# Altium schematic symbol library Molex FFC - FPC Connectors (SMT).SchLib: 638 symbols (part 9 of 10)
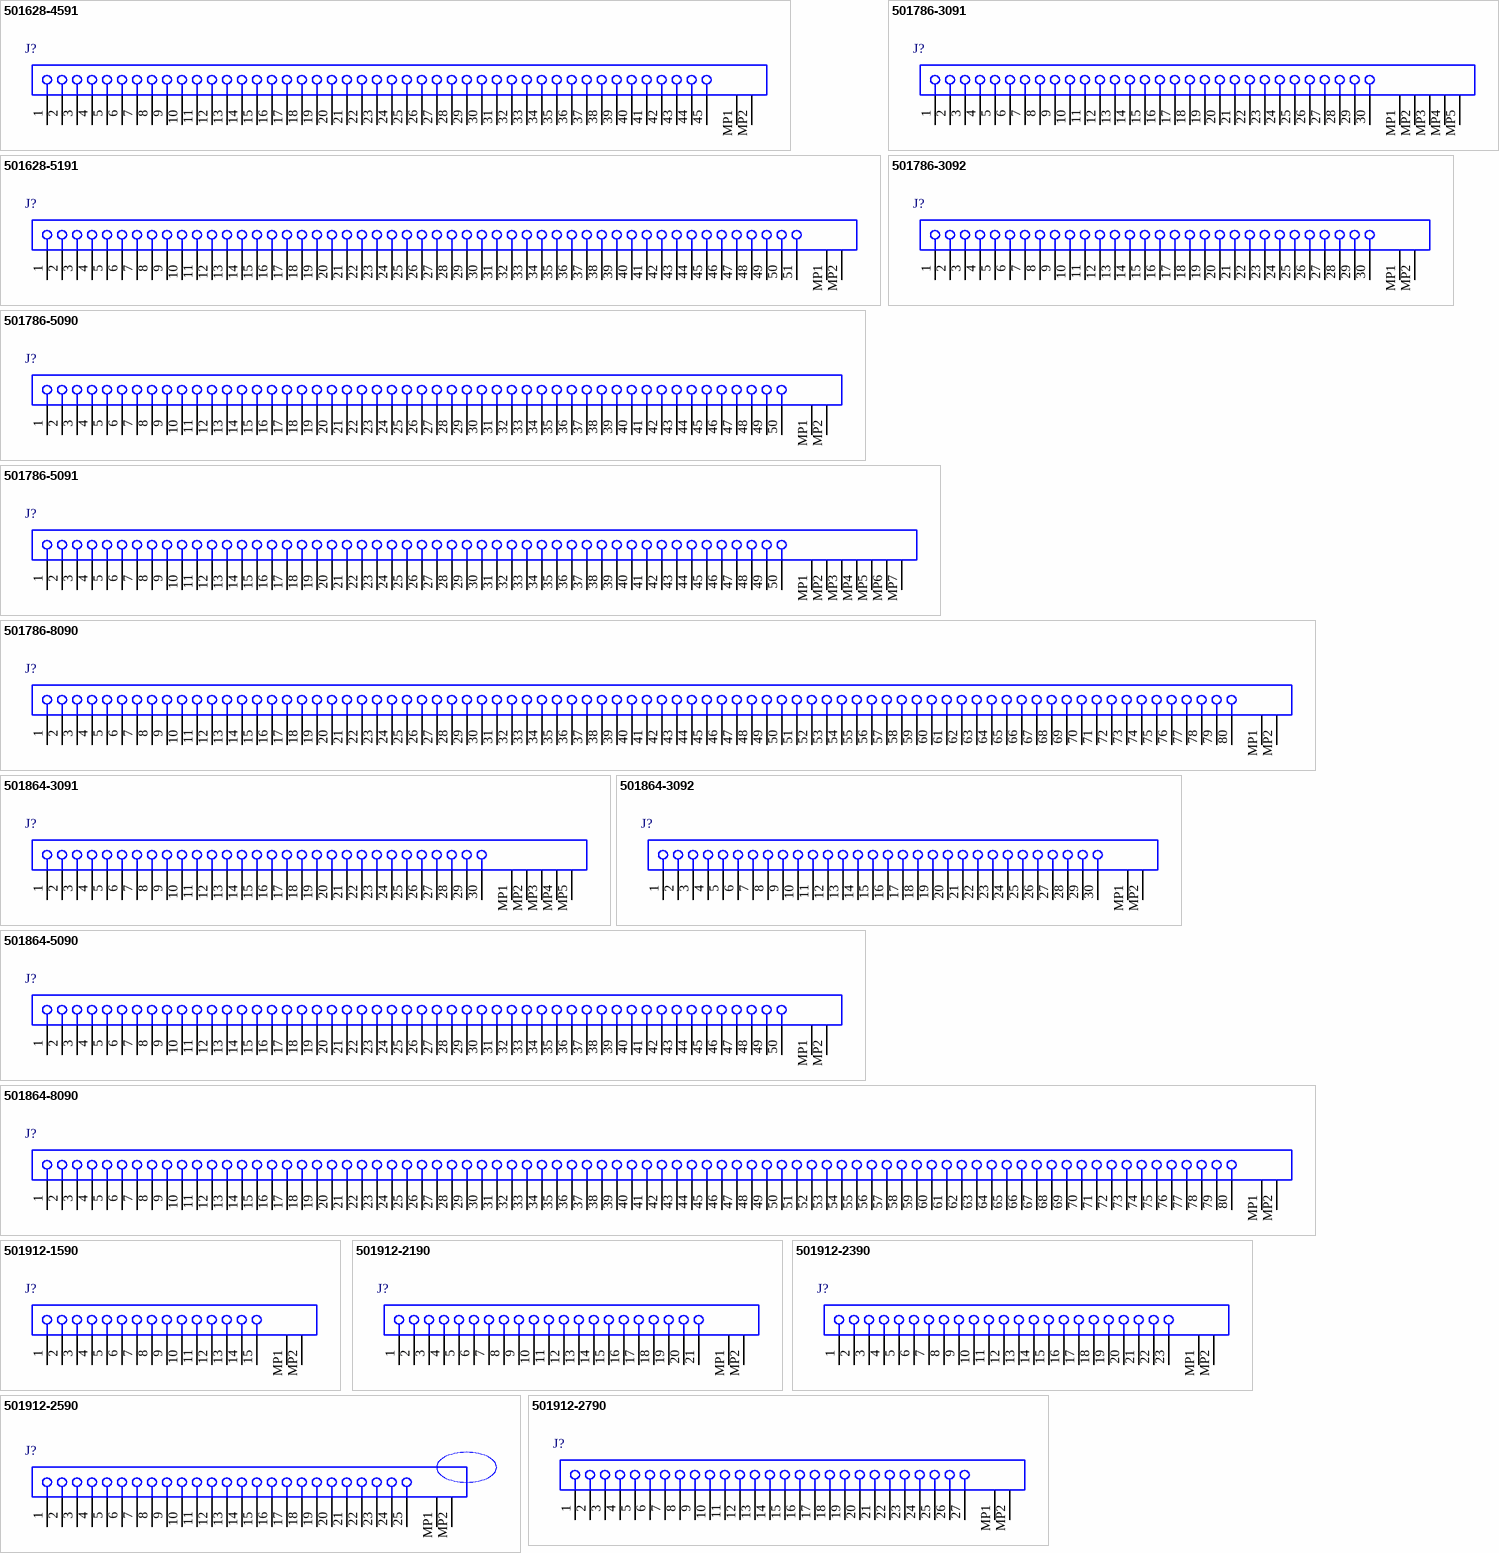
[diagram p29: symbols 501628-4591 to 501912-2790]

## 501786-3092
designator J?
0.5 mm Pitch Easy-On(TM) Type FFC Connector, 8.95 mm Mated Height, Vertical, SMT, 30 Circuits, -40 to 85 degC, ELV and RoHS Compliant, Tape and Reel; Manufacturer: Molex; PartNumber: 501786-3092; Circuits (Loaded): 30; Current (Max per Contact): 0.5A; Durability (mating cycles max): 20; Mated Height: 8.95mm; Material - Metal: Copper Alloy; Material - Plating Mating: Gold; PCB Locator: Yes; Pitch - Mating Interface: 0.50mm; Stackable: No; Voltage (Max): 50V AC (RMS)/DC; PackageVersion: Rev. A, 10/2009; PackageReference: 501786-3092; PackageDescription: 30-Lead FFC Connector, Pitch 0.5 mm; Contact Position: N/A; Entry Angle: Vertical; Material - Plating Termination: Gold; Number of Rows: 1; Orientation: Vertical; Packing: Tape and Reel; PCB Retention: Yes; Polarized to PCB: Yes; RoHS: TRUE; Mounting Technology: Surface Mount; ComponentLink1Description: Manufacturer URL; ComponentLink1URL: http://www.molex.com/molex/index.jsp; ComponentLink2Description: Datasheet; ComponentLink2URL: http://www.molex.com/webdocs/datasheets/pdf/en-us/5017863092_FFC_FPC_CONNECTORS.pdf; ComponentLink3Description: Package Specification; ComponentLink3URL: http://www.molex.com/pdm_docs/sd/5017863092_sd.pdf
footprint MOLX-501786-3092 (FFC Connector, 30-Leads, Vertical, Pitch 0.5 mm, Mated Height 8.95 mm, SMT)
pins: 1, 2, 3, 4, 5, 6, 7, 8, 9, 10, 11, 12, 13, 14, 15, 16, 17, 18, 19, 20, 21, 22, 23, 24, 25, 26, 27, 28, 29, 30, MP1, MP2

## 501786-5090
designator J?
0.5 mm Pitch Easy-On(TM) Type FFC Connector, 8.95 mm Mated Height, Vertical, SMT, 50 Circuits, -40 to 85 degC, ELV and RoHS Compliant, Tape and Reel; Manufacturer: Molex; PartNumber: 501786-5090; Circuits (Loaded): 50; Current (Max per Contact): 0.5A; Durability (mating cycles max): 20; Mated Height: 8.95mm; Material - Metal: Copper Alloy; Material - Plating Mating: Gold; PCB Locator: Yes; Pitch - Mating Interface: 0.50mm; Stackable: No; Voltage (Max): 50V AC (RMS)/DC; PackageVersion: Rev. A, 05/2010; PackageReference: 501786-5090; PackageDescription: 50-Lead FFC Connector, Pitch 0.5 mm; Contact Position: N/A; Entry Angle: Vertical; Material - Plating Termination: Gold; Number of Rows: 1; Orientation: Vertical; Packing: Tape and Reel; PCB Retention: Yes; Polarized to PCB: Yes; RoHS: TRUE; Mounting Technology: Surface Mount; ComponentLink1Description: Manufacturer URL; ComponentLink1URL: http://www.molex.com/molex/index.jsp; ComponentLink2Description: Datasheet; ComponentLink2URL: http://www.molex.com/webdocs/datasheets/pdf/en-us/5017865090_FFC_FPC_CONNECTORS.pdf; ComponentLink3Description: Package Specification; ComponentLink3URL: http://www.molex.com/pdm_docs/sd/5017865090_sd.pdf
footprint MOLX-501786-5090 (FFC Connector, 50-Leads, Vertical, Pitch 0.5 mm, Mated Height 8.95 mm, SMT)
pins: 1, 2, 3, 4, 5, 6, 7, 8, 9, 10, 11, 12, 13, 14, 15, 16, 17, 18, 19, 20, 21, 22, 23, 24, 25, 26, 27, 28, 29, 30, 31, 32, 33, 34, 35, 36, 37, 38, 39, 40, 41, 42, 43, 44, 45, 46, 47, 48, 49, 50, MP1, MP2

## 501786-5091
designator J?
0.5 mm Pitch Easy-On(TM) Type FFC Connector, 8.95 mm Mated Height, Vertical, SMT, 50 Circuits, -40 to 85 degC, ELV and RoHS Compliant, Tape and Reel; Manufacturer: Molex; PartNumber: 501786-5091; Circuits (Loaded): 50; Current (Max per Contact): 0.5A; Durability (mating cycles max): 20; Mated Height: 8.95mm; Material - Metal: Copper Alloy; Material - Plating Mating: Gold; PCB Locator: Yes; Pitch - Mating Interface: 0.50mm; Stackable: No; Voltage (Max): 50V AC (RMS)/DC; PackageVersion: Rev. A, 10/2009; PackageReference: 501786-5091; PackageDescription: 50-Lead FFC Connector, Pitch 0.5 mm; Contact Position: N/A; Entry Angle: Vertical; Material - Plating Termination: Gold; Number of Rows: 1; Orientation: Vertical; Packing: Tape and Reel; PCB Retention: Yes; Polarized to PCB: Yes; RoHS: TRUE; Mounting Technology: Surface Mount; ComponentLink1Description: Manufacturer URL; ComponentLink1URL: http://www.molex.com/molex/index.jsp; ComponentLink2Description: Datasheet; ComponentLink2URL: http://www.molex.com/webdocs/datasheets/pdf/en-us/5017865091_FFC_FPC_CONNECTORS.pdf; ComponentLink3Description: Package Specification; ComponentLink3URL: http://www.molex.com/pdm_docs/sd/5017865091_sd.pdf
footprint MOLX-501786-5091 (FFC Connector, 50-Leads, Vertical, Pitch 0.5 mm, Mated Height 8.95 mm, SMT)
pins: 1, 2, 3, 4, 5, 6, 7, 8, 9, 10, 11, 12, 13, 14, 15, 16, 17, 18, 19, 20, 21, 22, 23, 24, 25, 26, 27, 28, 29, 30, 31, 32, 33, 34, 35, 36, 37, 38, 39, 40, 41, 42, 43, 44, 45, 46, 47, 48, 49, 50, MP1, MP2, MP3, MP4, MP5, MP6, MP7

## 501786-8090
designator J?
0.5 mm Pitch Easy-On(TM) Type FFC Connector, 8.95 mm Mated Height, Vertical, SMT, 80 Circuits, -40 to 85 degC, ELV and RoHS Compliant, Tape and Reel; Manufacturer: Molex; PartNumber: 501786-8090; Circuits (Loaded): 80; Current (Max per Contact): 0.5A; Durability (mating cycles max): 20; Mated Height: 8.95mm; Material - Metal: Copper Alloy; Material - Plating Mating: Gold; PCB Locator: Yes; Pitch - Mating Interface: 0.50mm; Stackable: No; Voltage (Max): 50V AC (RMS)/DC; PackageVersion: Rev. A, 05/2010; PackageReference: 501786-8090; PackageDescription: 80-Lead FFC Connector, Pitch 0.5 mm; Contact Position: N/A; Entry Angle: Vertical; Material - Plating Termination: Gold; Number of Rows: 1; Orientation: Vertical; Packing: Tape and Reel; PCB Retention: Yes; Polarized to PCB: Yes; RoHS: TRUE; Mounting Technology: Surface Mount; ComponentLink1Description: Manufacturer URL; ComponentLink1URL: http://www.molex.com/molex/index.jsp; ComponentLink2Description: Datasheet; ComponentLink2URL: http://www.molex.com/webdocs/datasheets/pdf/en-us/5017868090_FFC_FPC_CONNECTORS.pdf; ComponentLink3Description: Package Specification; ComponentLink3URL: http://www.molex.com/pdm_docs/sd/5017868090_sd.pdf
footprint MOLX-501786-8090 (FFC Connector, 80-Leads, Vertical, Pitch 0.5 mm, Mated Height 8.95 mm, SMT)
pins: 1, 2, 3, 4, 5, 6, 7, 8, 9, 10, 11, 12, 13, 14, 15, 16, 17, 18, 19, 20, 21, 22, 23, 24, 25, 26, 27, 28, 29, 30, 31, 32, 33, 34, 35, 36, 37, 38, 39, 40, 41, 42, 43, 44, 45, 46, 47, 48, 49, 50, 51, 52, 53, 54, 55, 56, 57, 58, 59, 60, 61, 62, 63, 64, 65, 66, 67, 68, 69, 70, 71, 72, 73, 74, 75, 76, 77, 78, 79, 80, MP1, MP2

## 501864-3091
designator J?
0.5 mm Pitch Easy-On(TM) Type FFC Connector, 4.85 mm Mated Height, Right Angle, SMT, Bottom Contact, 30 Circuits, -40 to 85 degC, ELV and RoHS Compliant, Tape and Reel; Manufacturer: Molex; PartNumber: 501864-3091; Circuits (Loaded): 30; Current (Max per Contact): 0.5A; Durability (mating cycles max): 20; Entry Angle: 90degrees Angle; Mated Height: 4.85mm; Material - Metal: Phosphor Bronze; Material - Plating Mating: Gold; PCB Locator: Yes; Pitch - Mating Interface: 0.50mm; Stackable: No; Voltage (Max): 50V AC (RMS)/DC; PackageVersion: Rev. C, 09/2013; PackageReference: 501864-3091; PackageDescription: 30-Lead FFC Connector, Pitch 0.5 mm; Contact Position: Bottom; Material - Plating Termination: Gold; Number of Rows: 1; Orientation: Right Angle; Packing: Tape and Reel; PCB Retention: Yes; Polarized to PCB: Yes; RoHS: TRUE; Mounting Technology: Surface Mount; ComponentLink1Description: Manufacturer URL; ComponentLink1URL: http://www.molex.com/molex/index.jsp; ComponentLink2Description: Datasheet; ComponentLink2URL: http://www.molex.com/webdocs/datasheets/pdf/en-us/5018643091_FFC_FPC_CONNECTORS.pdf; ComponentLink3Description: Package Specification; ComponentLink3URL: http://www.molex.com/pdm_docs/sd/5018643091_sd.pdf
footprint MOLX-501864-3091 (FFC Connector, 30-Leads, Right Angle, Pitch 0.5 mm, Mated Height 4.85 mm, SMT)
pins: 1, 2, 3, 4, 5, 6, 7, 8, 9, 10, 11, 12, 13, 14, 15, 16, 17, 18, 19, 20, 21, 22, 23, 24, 25, 26, 27, 28, 29, 30, MP1, MP2, MP3, MP4, MP5

## 501864-3092
designator J?
0.5 mm Pitch Easy-On(TM) Type FFC Connector, 4.85 mm Mated Height, Right Angle, SMT, Bottom Contact, 30 Circuits, -40 to 85 degC, ELV and RoHS Compliant, Tape and Reel; Manufacturer: Molex; PartNumber: 501864-3092; Circuits (Loaded): 30; Current (Max per Contact): 0.5A; Durability (mating cycles max): 20; Entry Angle: 90degrees Angle; Mated Height: 4.85mm; Material - Metal: Copper Alloy; Material - Plating Mating: Gold; PCB Locator: Yes; Pitch - Mating Interface: 0.50mm; Stackable: No; Voltage (Max): 50V AC (RMS)/DC; PackageVersion: Rev. A, 09/2013; PackageReference: 501864-3092; PackageDescription: 30-Lead FFC Connector, Pitch 0.5 mm; Contact Position: Bottom; Material - Plating Termination: Gold; Number of Rows: 1; Orientation: Right Angle; Packing: Tape and Reel; PCB Retention: Yes; Polarized to PCB: Yes; RoHS: TRUE; Mounting Technology: Surface Mount; ComponentLink1Description: Manufacturer URL; ComponentLink1URL: http://www.molex.com/molex/index.jsp; ComponentLink2Description: Datasheet; ComponentLink2URL: http://www.molex.com/webdocs/datasheets/pdf/en-us/5018643092_FFC_FPC_CONNECTORS.pdf; ComponentLink3Description: Package Specification; ComponentLink3URL: http://www.molex.com/pdm_docs/sd/5018643092_sd.pdf
footprint MOLX-501864-3092 (FFC Connector, 30-Leads, Right Angle, Pitch 0.5 mm, Mated Height 4.85 mm, SMT)
pins: 1, 2, 3, 4, 5, 6, 7, 8, 9, 10, 11, 12, 13, 14, 15, 16, 17, 18, 19, 20, 21, 22, 23, 24, 25, 26, 27, 28, 29, 30, MP1, MP2

## 501864-5090
designator J?
0.5 mm Pitch Easy-On(TM) Type FFC Connector, 4.85 mm Mated Height, Right Angle, SMT, Bottom Contact, 50 Circuits, -40 to 85 degC, ELV and RoHS Compliant, Tape and Reel; Manufacturer: Molex; PartNumber: 501864-5090; Circuits (Loaded): 50; Current (Max per Contact): 0.5A; Durability (mating cycles max): 20; Entry Angle: 90degrees Angle; Mated Height: 4.85mm; Material - Metal: Copper Alloy; Material - Plating Mating: Gold; PCB Locator: Yes; Pitch - Mating Interface: 0.50mm; Stackable: No; Voltage (Max): 50V AC (RMS)/DC; PackageVersion: Rev. A, 05/2010; PackageReference: 501864-5090; PackageDescription: 50-Lead FFC Connector, Pitch 0.5 mm; Contact Position: Bottom; Material - Plating Termination: Gold; Number of Rows: 1; Orientation: Right Angle; Packing: Tape and Reel; PCB Retention: Yes; Polarized to PCB: Yes; RoHS: TRUE; Mounting Technology: Surface Mount; ComponentLink1Description: Manufacturer URL; ComponentLink1URL: http://www.molex.com/molex/index.jsp; ComponentLink2Description: Datasheet; ComponentLink2URL: http://www.molex.com/webdocs/datasheets/pdf/en-us/5018645090_FFC_FPC_CONNECTORS.pdf; ComponentLink3Description: Package Specification; ComponentLink3URL: http://www.molex.com/pdm_docs/sd/5018645090_sd.pdf
footprint MOLX-501864-5090 (FFC Connector, 50-Leads, Right Angle, Pitch 0.5 mm, Mated Height 4.85 mm, SMT)
pins: 1, 2, 3, 4, 5, 6, 7, 8, 9, 10, 11, 12, 13, 14, 15, 16, 17, 18, 19, 20, 21, 22, 23, 24, 25, 26, 27, 28, 29, 30, 31, 32, 33, 34, 35, 36, 37, 38, 39, 40, 41, 42, 43, 44, 45, 46, 47, 48, 49, 50, MP1, MP2

## 501864-8090
designator J?
0.5 mm Pitch Easy-On(TM) Type FFC Connector, 4.85 mm Mated Height, Right Angle, SMT, Bottom Contact, 80 Circuits, -40 to 85 degC, ELV and RoHS Compliant, Tape and Reel; Manufacturer: Molex; PartNumber: 501864-8090; Circuits (Loaded): 80; Current (Max per Contact): 0.5A; Durability (mating cycles max): 20; Entry Angle: 90degrees Angle; Mated Height: 4.85mm; Material - Metal: Copper Alloy; Material - Plating Mating: Gold; PCB Locator: Yes; Pitch - Mating Interface: 0.50mm; Stackable: No; Voltage (Max): 50V AC (RMS)/DC; PackageVersion: Rev. A, 05/2010; PackageReference: 501864-8090; PackageDescription: 80-Lead FFC Connector, Pitch 0.5 mm; Contact Position: Bottom; Material - Plating Termination: Gold; Number of Rows: 1; Orientation: Right Angle; Packing: Tape and Reel; PCB Retention: Yes; Polarized to PCB: Yes; RoHS: TRUE; Mounting Technology: Surface Mount; ComponentLink1Description: Manufacturer URL; ComponentLink1URL: http://www.molex.com/molex/index.jsp; ComponentLink2Description: Datasheet; ComponentLink2URL: http://www.molex.com/webdocs/datasheets/pdf/en-us/5018648090_FFC_FPC_CONNECTORS.pdf; ComponentLink3Description: Package Specification; ComponentLink3URL: http://www.molex.com/pdm_docs/sd/5018648090_sd.pdf
footprint MOLX-501864-8090 (FFC Connector, 80-Leads, Right Angle, Pitch 0.5 mm, Mated Height 4.85 mm, SMT)
pins: 1, 2, 3, 4, 5, 6, 7, 8, 9, 10, 11, 12, 13, 14, 15, 16, 17, 18, 19, 20, 21, 22, 23, 24, 25, 26, 27, 28, 29, 30, 31, 32, 33, 34, 35, 36, 37, 38, 39, 40, 41, 42, 43, 44, 45, 46, 47, 48, 49, 50, 51, 52, 53, 54, 55, 56, 57, 58, 59, 60, 61, 62, 63, 64, 65, 66, 67, 68, 69, 70, 71, 72, 73, 74, 75, 76, 77, 78, 79, 80, MP1, MP2

## 501912-1590
designator J?
0.3 mm Pitch Easy-On(TM) Type FPC Connector, 1.8 mm Mated Height, Right Angle, SMT, Bottom Contact, 15 Circuits, -20 to 85 degC, ELV and RoHS Compliant, Tape and Reel; Manufacturer: Molex; PartNumber: 501912-1590; Circuits (Loaded): 15; Current (Max per Contact): 0.2A; Durability (mating cycles max): 20; Entry Angle: 90degrees Angle; Mated Height: 1.80mm; Material - Metal: Copper, Phosphor Bronze; Material - Plating Mating: Gold; PCB Locator: No; PCB Retention: None; Pitch - Mating Interface: 0.30mm; Voltage (Max): 50V AC (RMS)/DC; PackageVersion: Rev. F, 04/2008; PackageReference: 501912-1590; PackageDescription: 15-Lead FPC Connector, Pitch 0.3 mm; Circuits (maximum): 15; Contact Position: Bottom; Material - Plating Termination: Gold; Number of Rows: 1; Orientation: Right Angle; Packing: Tape and Reel; Pitch - Termination Interface: 0.30mm; Polarized to PCB: No; RoHS: TRUE; Stackable: No; Mounting Technology: Surface Mount; ComponentLink1Description: Manufacturer URL; ComponentLink1URL: http://www.molex.com/molex/index.jsp; ComponentLink2Description: Datasheet; ComponentLink2URL: http://www.molex.com/webdocs/datasheets/pdf/en-us/5019121590_FFC_FPC_CONNECTORS.pdf; ComponentLink3Description: Package Specification; ComponentLink3URL: http://www.molex.com/pdm_docs/sd/5019121590_sd.pdf
footprint MOLX-501912-1590 (FPC Connector, 15-Leads, Right Angle, Pitch 0.3 mm, Mated Height 1.8 mm, SMT)
pins: 1, 2, 3, 4, 5, 6, 7, 8, 9, 10, 11, 12, 13, 14, 15, MP1, MP2

## 501912-2190
designator J?
0.3 mm Pitch Easy-On(TM) Type FPC Connector, 1.8 mm Mated Height, Right Angle, SMT, Bottom Contact, 21 Circuits, -20 to 85 degC, ELV and RoHS Compliant, Tape and Reel; Manufacturer: Molex; PartNumber: 501912-2190; Circuits (Loaded): 21; Current (Max per Contact): 0.2A; Durability (mating cycles max): 20; Entry Angle: 90degrees Angle; Mated Height: 1.80mm; Material - Metal: Copper, Phosphor Bronze; Material - Plating Mating: Gold; PCB Locator: No; PCB Retention: None; Pitch - Mating Interface: 0.30mm; Voltage (Max): 50V AC (RMS)/DC; PackageVersion: Rev. F, 04/2008; PackageReference: 501912-2190; PackageDescription: 21-Lead FPC Connector, Pitch 0.3 mm; Circuits (maximum): 21; Contact Position: Bottom; Material - Plating Termination: Gold; Number of Rows: 1; Orientation: Right Angle; Packing: Tape and Reel; Pitch - Termination Interface: 0.30mm; Polarized to PCB: No; RoHS: TRUE; Stackable: No; Mounting Technology: Surface Mount; ComponentLink1Description: Manufacturer URL; ComponentLink1URL: http://www.molex.com/molex/index.jsp; ComponentLink2Description: Datasheet; ComponentLink2URL: http://www.molex.com/webdocs/datasheets/pdf/en-us/5019122190_FFC_FPC_CONNECTORS.pdf; ComponentLink3Description: Package Specification; ComponentLink3URL: http://www.molex.com/pdm_docs/sd/5019122190_sd.pdf
footprint MOLX-501912-2190 (FPC Connector, 21-Leads, Right Angle, Pitch 0.3 mm, Mated Height 1.8 mm, SMT)
pins: 1, 2, 3, 4, 5, 6, 7, 8, 9, 10, 11, 12, 13, 14, 15, 16, 17, 18, 19, 20, 21, MP1, MP2

## 501912-2390
designator J?
0.3 mm Pitch Easy-On(TM) Type FPC Connector, 1.8 mm Mated Height, Right Angle, SMT, Bottom Contact, 23 Circuits, -20 to 85 degC, ELV and RoHS Compliant, Tape and Reel; Manufacturer: Molex; PartNumber: 501912-2390; Circuits (Loaded): 23; Current (Max per Contact): 0.2A; Durability (mating cycles max): 20; Entry Angle: 90degrees Angle; Mated Height: 1.80mm; Material - Metal: Copper, Phosphor Bronze; Material - Plating Mating: Gold; PCB Locator: No; PCB Retention: None; Pitch - Mating Interface: 0.30mm; Voltage (Max): 50V AC (RMS)/DC; PackageVersion: Rev. F, 04/2008; PackageReference: 501912-2390; PackageDescription: 23-Lead FPC Connector, Pitch 0.3 mm; Circuits (maximum): 23; Contact Position: Bottom; Material - Plating Termination: Gold; Number of Rows: 1; Orientation: Right Angle; Packing: Tape and Reel; Pitch - Termination Interface: 0.30mm; Polarized to PCB: No; RoHS: TRUE; Stackable: No; Mounting Technology: Surface Mount; ComponentLink1Description: Manufacturer URL; ComponentLink1URL: http://www.molex.com/molex/index.jsp; ComponentLink2Description: Datasheet; ComponentLink2URL: http://www.molex.com/webdocs/datasheets/pdf/en-us/5019122390_FFC_FPC_CONNECTORS.pdf; ComponentLink3Description: Package Specification; ComponentLink3URL: http://www.molex.com/pdm_docs/sd/5019122390_sd.pdf
footprint MOLX-501912-2390 (FPC Connector, 23-Leads, Right Angle, Pitch 0.3 mm, Mated Height 1.8 mm, SMT)
pins: 1, 2, 3, 4, 5, 6, 7, 8, 9, 10, 11, 12, 13, 14, 15, 16, 17, 18, 19, 20, 21, 22, 23, MP1, MP2

## 501912-2590
designator J?
0.3 mm Pitch Easy-On(TM) Type FPC Connector, 1.8 mm Mated Height, Right Angle, SMT, Bottom Contact, 25 Circuits, -20 to 85 degC, ELV and RoHS Compliant, Tape and Reel; Manufacturer: Molex; PartNumber: 501912-2590; Circuits (Loaded): 25; Current (Max per Contact): 0.2A; Durability (mating cycles max): 20; Entry Angle: 90degrees Angle; Mated Height: 1.80mm; Material - Metal: Copper, Phosphor Bronze; Material - Plating Mating: Gold; PCB Locator: No; PCB Retention: None; Pitch - Mating Interface: 0.30mm; Voltage (Max): 50V AC (RMS)/DC; PackageVersion: Rev. F, 04/2008; PackageReference: 501912-2590; PackageDescription: 25-Lead FPC Connector, Pitch 0.3 mm; Circuits (maximum): 25; Contact Position: Bottom; Material - Plating Termination: Gold; Number of Rows: 1; Orientation: Right Angle; Packing: Tape and Reel; Pitch - Termination Interface: 0.30mm; Polarized to PCB: No; RoHS: TRUE; Stackable: No; Mounting Technology: Surface Mount; ComponentLink1Description: Manufacturer URL; ComponentLink1URL: http://www.molex.com/molex/index.jsp; ComponentLink2Description: Datasheet; ComponentLink2URL: http://www.molex.com/webdocs/datasheets/pdf/en-us/5019122590_FFC_FPC_CONNECTORS.pdf; ComponentLink3Description: Package Specification; ComponentLink3URL: http://www.molex.com/pdm_docs/sd/5019122590_sd.pdf
footprint MOLX-501912-2590 (FPC Connector, 25-Leads, Right Angle, Pitch 0.3 mm, Mated Height 1.8 mm, SMT)
pins: 1, 2, 3, 4, 5, 6, 7, 8, 9, 10, 11, 12, 13, 14, 15, 16, 17, 18, 19, 20, 21, 22, 23, 24, 25, MP1, MP2

## 501912-2790
designator J?
0.3 mm Pitch Easy-On(TM) Type FPC Connector, 1.8 mm Mated Height, Right Angle, SMT, Bottom Contact, 27 Circuits, -20 to 85 degC, ELV and RoHS Compliant, Tape and Reel; Manufacturer: Molex; PartNumber: 501912-2790; Circuits (Loaded): 27; Current (Max per Contact): 0.2A; Durability (mating cycles max): 20; Entry Angle: 90degrees Angle; Mated Height: 1.80mm; Material - Metal: Copper, Phosphor Bronze; Material - Plating Mating: Gold; PCB Locator: No; PCB Retention: None; Pitch - Mating Interface: 0.30mm; Voltage (Max): 50V AC (RMS)/DC; PackageVersion: Rev. F, 04/2008; PackageReference: 501912-2790; PackageDescription: 27-Lead FPC Connector, Pitch 0.3 mm; Circuits (maximum): 27; Contact Position: Bottom; Material - Plating Termination: Gold; Number of Rows: 1; Orientation: Right Angle; Packing: Tape and Reel; Pitch - Termination Interface: 0.30mm; Polarized to PCB: No; RoHS: TRUE; Stackable: No; Mounting Technology: Surface Mount; ComponentLink1Description: Manufacturer URL; ComponentLink1URL: http://www.molex.com/molex/index.jsp; ComponentLink2Description: Datasheet; ComponentLink2URL: http://www.molex.com/webdocs/datasheets/pdf/en-us/5019122790_FFC_FPC_CONNECTORS.pdf; ComponentLink3Description: Package Specification; ComponentLink3URL: http://www.molex.com/pdm_docs/sd/5019122790_sd.pdf
footprint MOLX-501912-2790 (FPC Connector, 27-Leads, Right Angle, Pitch 0.3 mm, Mated Height 1.8 mm, SMT)
pins: 1, 2, 3, 4, 5, 6, 7, 8, 9, 10, 11, 12, 13, 14, 15, 16, 17, 18, 19, 20, 21, 22, 23, 24, 25, 26, 27, MP1, MP2
